# Altium footprint library My Library.PcbLib: 872 footprints (part 36 of 55)
Each footprint in its own frame and in the unit in brackets; x right, y up, seen from the top. Pads: shape width x height; smd on the part's side, far side on the other; paste and mask are expansions set on the pad; w line width, h text height; cw(c..) or ccw(c..) is an arc to the next point about the centre after c.
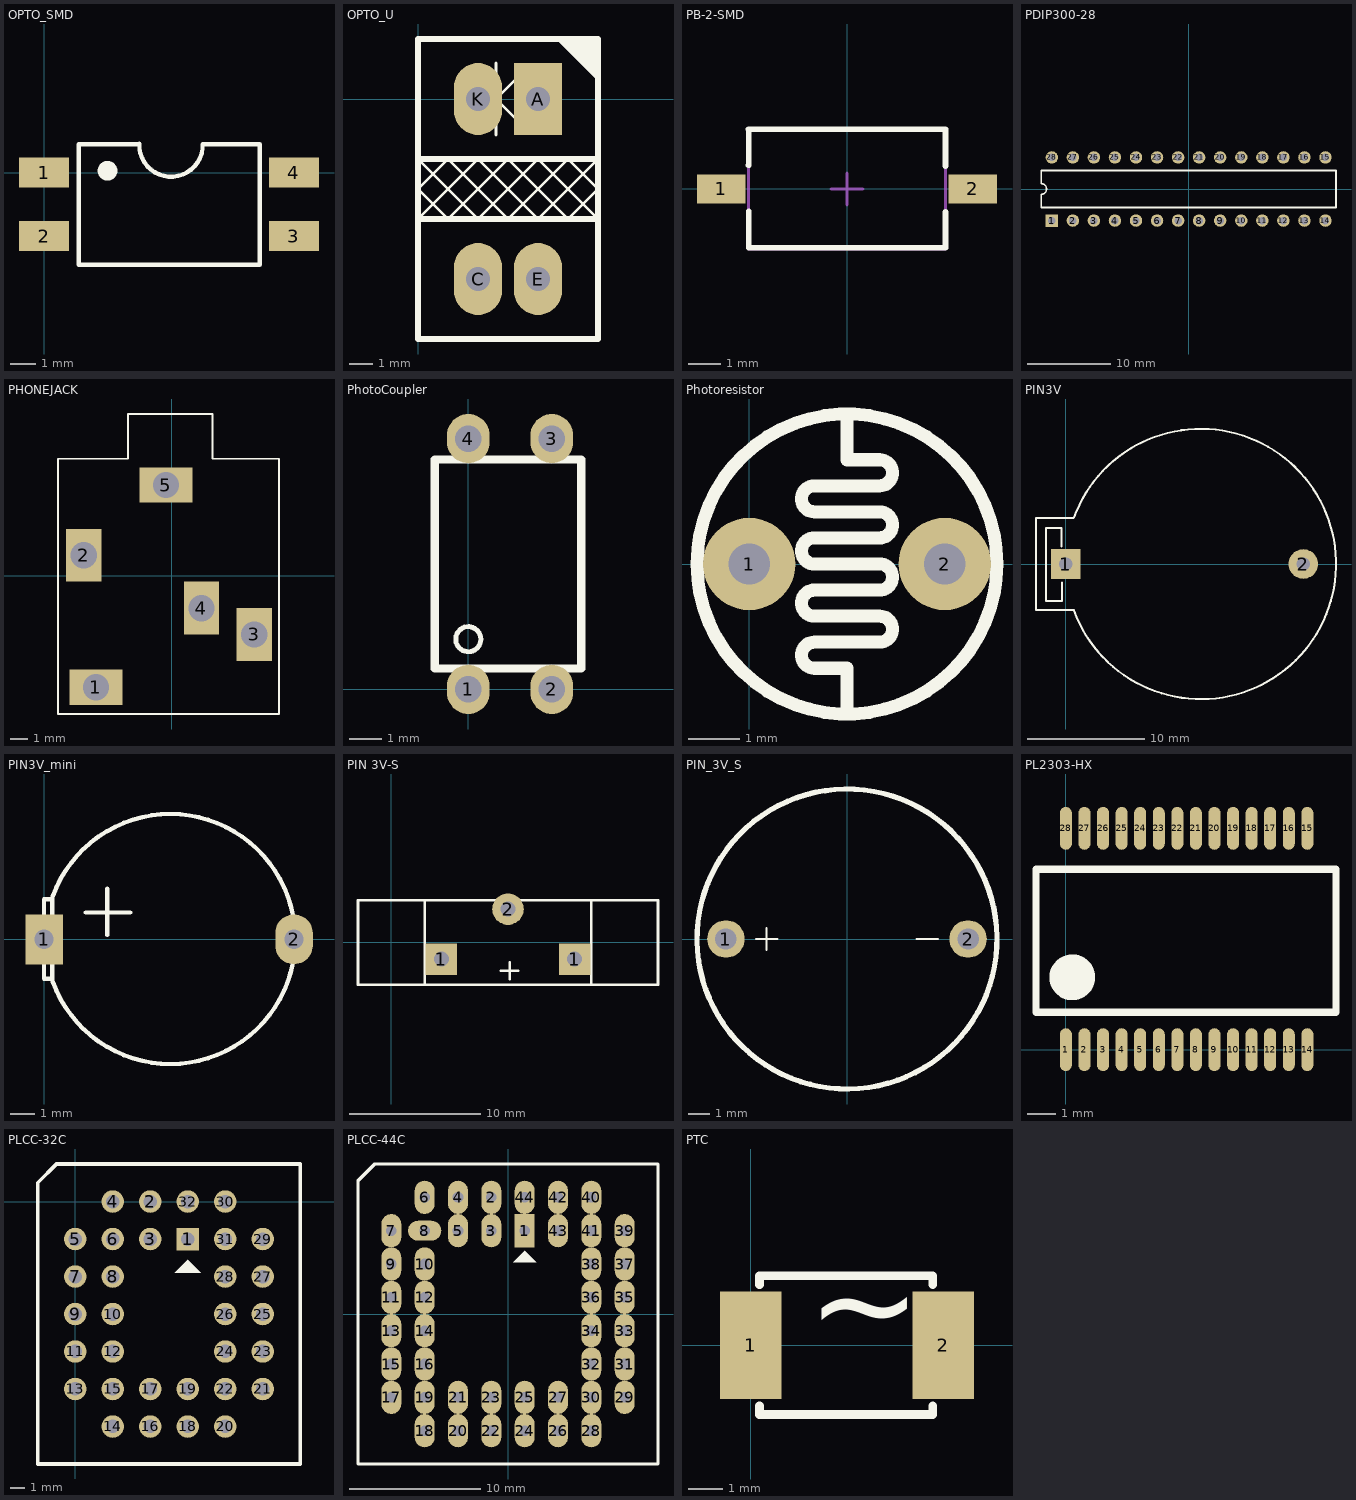
[diagram p35: the footprints below, top view; thin cyan lines are the x and y axes]

## OPTO_SMD [mm]
pads (4):
  rect 2x1.2 smd: 1(0,0) 2(0,-2.54) 3(10,-2.54) 4(10,0)
Top Overlay:
  circle w0.381: c2.54,0.076 r0.203
  lines w0.178: 3.81,1.143 1.397,1.143 1.397,-3.683 8.636,-3.683 8.636,1.143 6.375,1.143 ; 3.811,1.153 ccw(c5.08,1.11) 6.35,1.143
3D body "User Library-PC817_Gullwing.STEP": height 3.95, standoff 0.1, extent 0.08,-3.556 10.08,1.024

## OPTO_U [mil] "Opto hinh chu U"
height 104.33
pads (4):
  rect 80x120 hole 40: A(200,0)
  oval 80x120 hole 40: C(100,-300) E(200,-300) K(100,0)
Top Overlay:
  region: 297.5,97.5 232.5,97.5 297.5,32.5
  lines w5: 0,-200 50,-150 100,-100 200,-200 230,-170 300,-100 300,-200 200,-100 100,-200 90,-190 60,-160 0,-100 ; 130,-60 130,60 ; 180,-50 180,50 ; 180,-50 180,50 ; 180,-50 130,0 180,50 ; 0,-150 30,-180 50,-200 150,-100 250,-200 300,-150 250,-100 150,-200 50,-100 0,-150
  lines w10: 0,-200 300,-200 ; 0,-150 0,-110 ; 0,-100 300,-100 ; 300,-150 300,-140 ; 0,-400 300,-400 300,100 0,100 0,-400
3D body "SW3dPS-optek opb620.STEP": height 374.02, standoff -100, extent 43.46,-346.85 260,46.85

## PB-2-SMD [mm]
height 3.7
pads (2):
  rect 1.5x0.9 smd: 1(-3.9,0) 2(3.9,0)
Top Overlay:
  lines w0.178: -3.05,0.737 -3.048,0.739 -3.048,1.85 ; -3.05,1.85 3.05,1.85 3.05,0.711 ; -3.048,-0.686 -3.048,-1.825 3.052,-1.825 ; 3.05,-1.825 3.05,-0.713 3.052,-0.711
Mechanical 13:
  lines w0.1: -3.048,-1.825 3.052,-1.825 ; -3.05,-1.85 -3.05,1.85 3.05,1.85 3.05,-1.85 -3.05,-1.85
Mechanical 15:
  lines w0.1: -0.5,0 0.5,0 ; 0,-0.5 0,0.5
3D body: height 0.2, standoff 0, extent 3.505,-0.356 4.343,0.356
3D body: height 0.95, standoff 0.75, extent 2.921,-0.356 3.759,0.356
3D body: height 0.95, standoff 0, extent 3.505,-0.356 3.759,0.356
3D body: height 0.95, standoff 0, extent -3.759,-0.356 -3.505,0.356
3D body: height 0.95, standoff 0.75, extent -3.759,-0.356 -2.921,0.356
3D body: height 0.2, standoff 0, extent -4.343,-0.356 -3.505,0.356
3D body: height 1.4, standoff 0, extent -3.05,-1.85 3.05,1.85
3D body: height 1.95, standoff 0.1, extent -2.31,-1.291 2.415,1.321
3D body: height 2.5, standoff 0.1, extent -1.841,-0.842 1.943,0.842

## PCBComponent_1 [mm]

## PDIP300-28 [mm] "DIP, Plastic, Skinny; 28 Leads; Row Spacing 7.62 mm; Pitch 2.54 mm"
height 4.07
pads (28):
  rect 1.5x1.5 hole 0.9: 1(-16.51,-3.81)
  round 1.5 hole 0.9: 2(-13.97,-3.81) 3(-11.43,-3.81) 4(-8.89,-3.81) 5(-6.35,-3.81) 6(-3.81,-3.81) 7(-1.27,-3.81) 8(1.27,-3.81) 9(3.81,-3.81) 10(6.35,-3.81) 11(8.89,-3.81) 12(11.43,-3.81) 13(13.97,-3.81) 14(16.51,-3.81) 15(16.51,3.81) 16(13.97,3.81) 17(11.43,3.81) 18(8.89,3.81) 19(6.35,3.81) 20(3.81,3.81) 21(1.27,3.81) 22(-1.27,3.81) 23(-3.81,3.81) 24(-6.35,3.81) 25(-8.89,3.81) 26(-11.43,3.81) 27(-13.97,3.81) 28(-16.51,3.81)
Top Overlay:
  lines w0.2: -17.78,-2.225 17.78,-2.225 17.78,2.225 -17.78,2.225 -17.78,0.635 cw(c-17.78,0) -17.78,-0.635 -17.78,-2.225

## PHONEJACK [mm]
pads (5):
  rect 3x2 hole 1.5: 1(-4.318,-6.35) 5(-0.34,5.151)
  rect 2x3 hole 1.5: 2(-5.013,1.15) 3(4.682,-3.35) 4(1.682,-1.85)
Top Overlay:
  lines w0.102: -6.477,-7.874 -6.477,6.65 -2.499,6.65 -2.499,9.19 0.381,9.19 2.302,9.19 2.302,6.65 6.096,6.65 6.096,-7.874 -6.477,-7.874
3D body: height 7.4, standoff 2.6, extent -2.498,6.651 2.283,9.151
3D body: height 10, standoff 0, extent -6.477,-7.874 6.096,6.731

## PhotoCoupler [mm] "Opto quang"
pads (4):
  oval 1.3x1.5 hole 0.8: 1(0,0) 2(2.54,0) 3(2.54,7.62) 4(0,7.62)
Top Overlay:
  circle w0.15: c0,1.524 r0.381
  lines w0.254: -1.016,0.635 3.429,0.635 3.429,6.985 -1.016,6.985 -1.016,0.635
3D body "SW3DPS-DIP4-DEFAULT.step": height 4.31, standoff -3.28, extent -1.532,-0.19 4.008,7.81

## Photoresistor [mm]
pads (2):
  round 1.8 hole 0.8: 1(0,0) 2(3.81,0)
Top Overlay:
  circle w0.254: c1.905,0 r2.924
  lines w0.254: 1.905,-2.921 1.905,-2.032 1.27,-2.032 cw(c1.27,-1.778) 1.27,-1.524 2.54,-1.524 ccw(c2.54,-1.27) 2.54,-1.016 1.27,-1.016 cw(c1.27,-0.762) 1.27,-0.508 2.54,-0.508 ccw(c2.54,-0.254) 2.54,0 1.27,0 cw(c1.27,0.254) 1.27,0.508 2.54,0.508 ccw(c2.54,0.762) 2.54,1.016 1.27,1.016 cw(c1.27,1.27) 1.27,1.524 2.54,1.524 ccw(c2.54,1.778) 2.54,2.032 1.905,2.032 1.905,2.921

## PIN3V [mil] "Socket PIN 3V"
pads (2):
  rect 100x100 hole 45: 1(0,0)
  round 100 hole 45: 2(800,0)
Top Overlay:
  lines w7: -14,59 -14,121 -66,121 -66,-124 -13,-124 -13,-63 ; 26.33,155 -100,155 -100,-155 27.93,-155 ; 27.6,156.07 cw(c455,0) 27.93,-156.97
3D body "batter2.STEP": height 278.16, standoff -137.2, extent -128.09,-446.83 1001.83,448.83

## PIN3V_mini [mil] "Socket PIN 3V"
pads (2):
  rect 60x80 hole 31: 1(0,0)
  oval 60x80 hole 31: 2(400,0)
Top Overlay:
  lines w7: 11,64 0,64 0,-63 13,-63 ; 13,-64 13,65 ; 14,-67.81 ccw(c201.94,0.6) 14,69 ; 67,43 138,43 ; 101,7 101,81

## PIN 3V-S [mil] "Socket PIN 3V"
pads (3):
  rect 95x95 hole 45: 1(150,-50) 1(550,-50)
  round 95 hole 45: 2(350,100)
Top Overlay:
  lines w8: 100,-127 100,127 ; 329,-85 380,-85 ; 355,-110 355,-60 ; 600,-127 600,127 ; -100,-127 -100,127 800,127 800,-127 -100,-127

## PIN_3V_S [mil]
pads (2):
  round 70 hole 40: 1(-226,0) 2(226,0)
Top Overlay:
  lines w4: -170,0 -130,0 ; -150,-20 -150,0 -150,20 ; 130,0 170,0
  lines w10: 279.07,22.83 ccw(c0,0) 279.14,21.9
3D body: height 118.11, standoff 0, extent -236.57,-236.57 236.57,236.57
3D body: height 117.72, standoff 0, extent -275,-275 276,275

## PL2303-HX [mil]
pads (28):
  oval 16.53x59.03 smd mask+7.9: 1(0,0) 2(25.6,0) 3(51.18,0) 4(76.78,0) 5(102.37,0) 6(127.97,0) 7(153.57,0) 8(179.15,0) 9(204.75,0) 10(230.35,0) 11(255.93,0) 12(281.53,0) 13(307.12,0) 14(332.7,0) 15(332.7,305) 16(307.12,305) 17(281.53,305) 18(255.93,305) 19(230.35,305) 20(204.75,305) 21(179.15,305) 22(153.57,305) 23(127.97,305) 24(102.37,305) 25(76.78,305) 26(51.18,305) 27(25.6,305) 28(0,305)
Top Overlay:
  circle w39.37: c8.8,99.7 r11.88
  lines w10: -41.22,51.66 -41.22,248.53 372.21,248.53 372.21,51.66 -41.22,51.66
3D body "SOP65P770x200-28N.step": height 84.65, standoff 0, extent -37.01,0.01 369.69,305.35

## PLCC-32C [mil] "Socket PLCC32R"
height 200
pads (32):
  rect 60x60 hole 36: 1(300,-100)
  round 60 hole 36: 2(200,0) 3(200,-100) 4(100,0) 5(0,-100) 6(100,-100) 7(0,-200) 8(100,-200) 9(0,-300) 10(100,-300) 11(0,-400) 12(100,-400) 13(0,-500) 14(100,-600) 15(100,-500) 16(200,-600) 17(200,-500) 18(300,-600) 19(300,-500) 20(400,-600) 21(500,-500) 22(400,-500) 23(500,-400) 24(400,-400) 25(500,-300) 26(400,-300) 27(500,-200) 28(400,-200) 29(500,-100) 30(400,0) 31(400,-100) 32(300,0)
Top Overlay:
  region: 300,-155 265,-190 335,-190
  lines w10: -100,-700 600,-700 600,100 -50,100 -100,50 -100,-700

## PLCC-44C [mil] "QPC-44C"
height 200
pads (44):
  rect 60x100 hole 32: 1(50,250)
  oval 60x100 hole 32: 2(-50,350) 3(-50,250) 4(-150,350) 5(-150,250) 6(-250,350) 7(-350,250) 9(-350,150) 10(-250,150) 11(-350,50) 12(-250,50) 13(-350,-50) 14(-250,-50) 15(-350,-150) 16(-250,-150) 17(-350,-250) 18(-250,-350) 19(-250,-250) 20(-150,-350) 21(-150,-250) 22(-50,-350) 23(-50,-250) 24(50,-350) 25(50,-250) 26(150,-350) 27(150,-250) 28(250,-350) 29(350,-250) 30(250,-250) 31(350,-150) 32(250,-150) 33(350,-50) 34(250,-50) 35(350,50) 36(250,50) 37(350,150) 38(250,150) 39(350,250) 40(250,350) 41(250,250) 42(150,350) 43(150,250) 44(50,350)
  oval 100x60 hole 32: 8(-250,250)
Top Overlay:
  region: 50,190 15,155 85,155
  lines w10: -450,-450 450,-450 450,450 -400,450 -450,400 -450,-450

## PTC [mm] "PTC protec over curent"
pads (2):
  rect 1.8x3.15 smd: 1(0,0) 2(5.639,0)
Top Overlay:
  lines w0.254: 0.254,-1.778 0.254,-2.032 5.334,-2.032 5.334,-1.778 ; 0.254,1.778 0.254,2.032 5.334,2.032 5.334,1.778
  text "~" at 1.651,-1.143 h5
3D body "SW3dPS-Fuse 1812.STEP": height 1.03, standoff 0, extent 0.455,-1.74 5.19,1.74